# Altium footprint library con-samtec.PCBLIB: 805 footprints (part 36 of 55)
Each footprint in its own frame and in the unit in brackets; x right, y up, seen from the top. Pads: shape width x height; smd on the part's side, far side on the other; paste and mask are expansions set on the pad; w line width, h text height; cw(c..) or ccw(c..) is an arc to the next point about the centre after c.
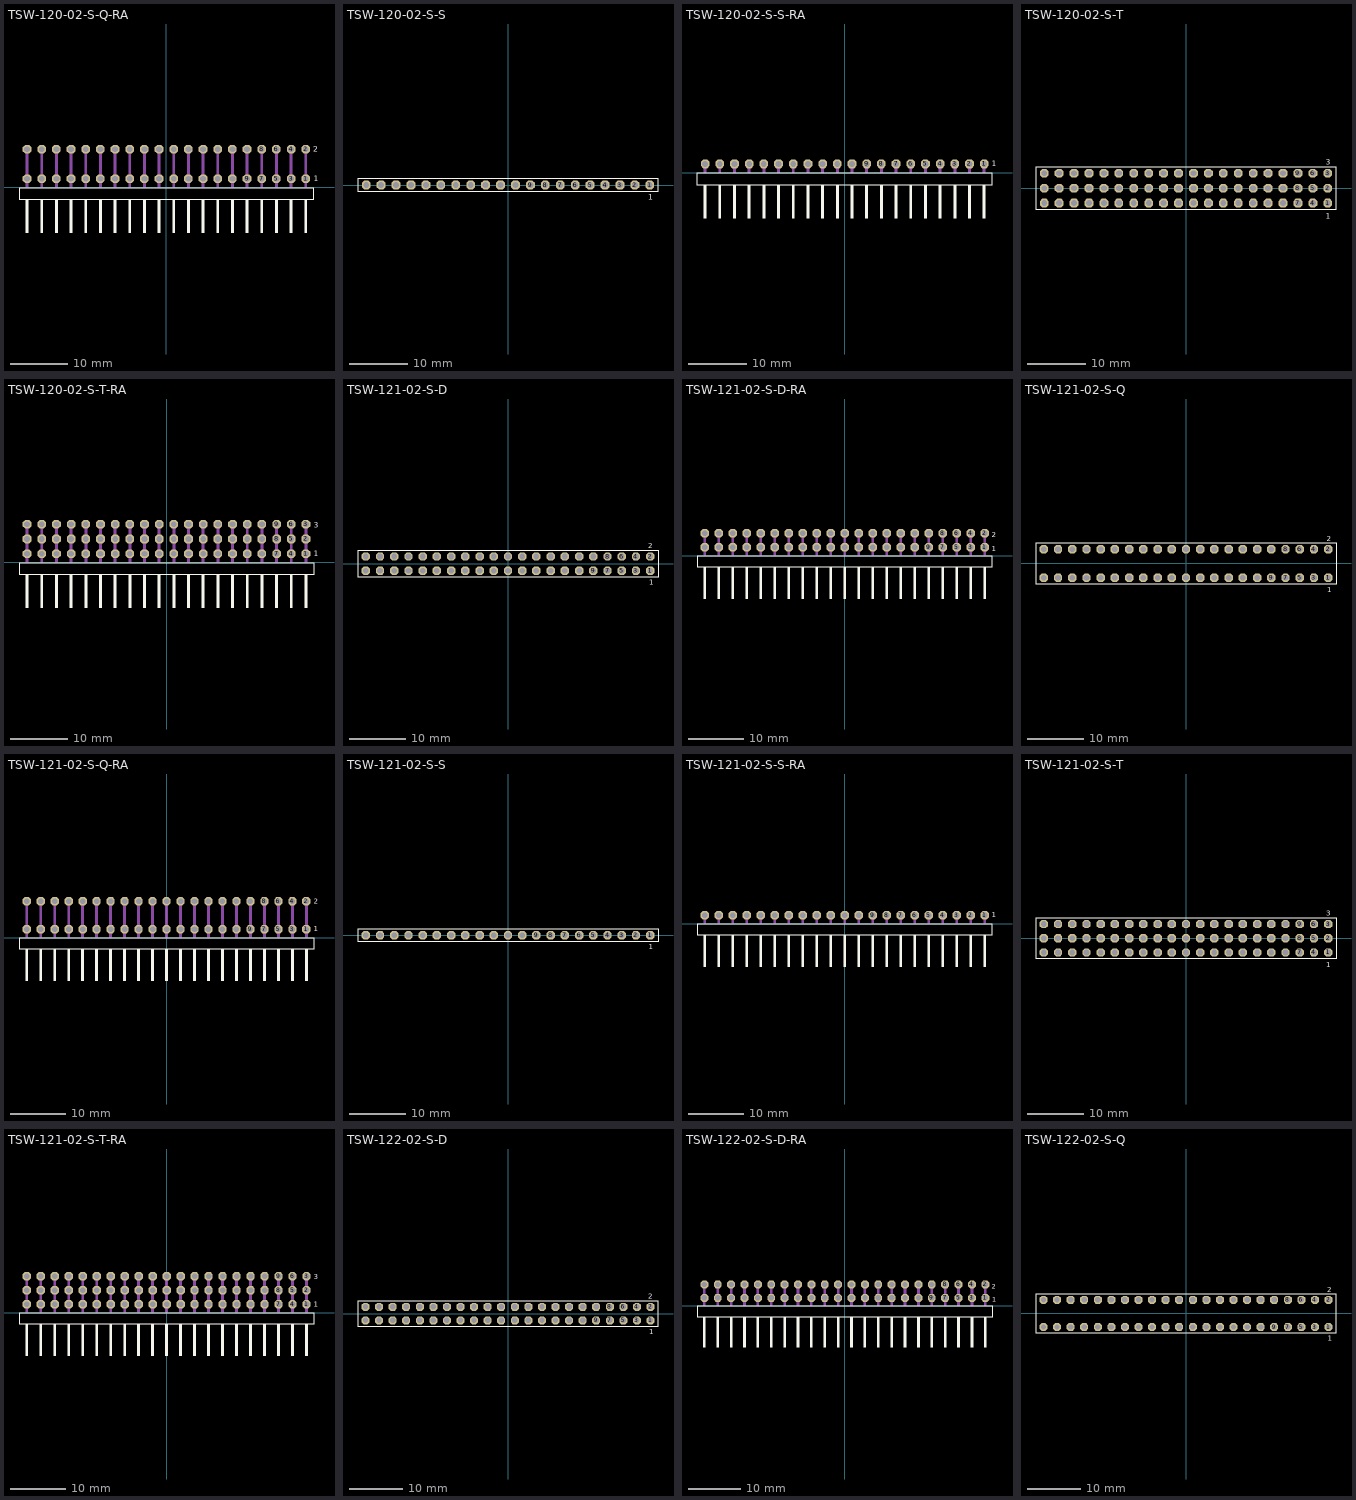
[diagram p35: the footprints below, top view; thin cyan lines are the x and y axes]

## TSW-120-02-S-Q-RA [mil]
pads (40):
  oct 59.06x59.06 hole 39.37: 1(950,60) 2(950,260) 3(850,60) 4(850,260) 5(750,60) 6(750,260) 7(650,60) 8(650,260) 9(550,60) 10(550,260) 11(450,60) 12(450,260) 13(350,60) 14(350,260) 15(250,60) 16(250,260) 17(150,60) 18(150,260) 19(50,60) 20(50,260) 21(-50,60) 22(-50,260) 23(-150,60) 24(-150,260) 25(-250,60) 26(-250,260) 27(-350,60) 28(-350,260) 29(-450,60) 30(-450,260) 31(-550,60) 32(-550,260) 33(-650,60) 34(-650,260) 35(-750,60) 36(-750,260) 37(-850,60) 38(-850,260) 39(-950,60) 40(-950,260)
Top Overlay:
  rectangle: -960,-310.63 -940,-80.32
  rectangle: -860,-310.63 -840,-80.32
  rectangle: -760,-310.63 -740,-80.32
  rectangle: -660,-310.63 -640,-80.32
  rectangle: -560,-310.63 -540,-80.32
  rectangle: -460,-310.63 -440,-80.32
  rectangle: -360,-310.63 -340,-80.32
  rectangle: -260,-310.63 -240,-80.32
  rectangle: -160,-310.63 -140,-80.32
  rectangle: -60,-310.63 -40,-80.32
  rectangle: 40,-310.63 60,-80.32
  rectangle: 140,-310.63 160,-80.32
  rectangle: 240,-310.63 260,-80.32
  rectangle: 340,-310.63 360,-80.32
  rectangle: 440,-310.63 460,-80.32
  rectangle: 540,-310.63 560,-80.32
  rectangle: 640,-310.63 660,-80.32
  rectangle: 740,-310.63 760,-80.32
  rectangle: 840,-310.63 860,-80.32
  rectangle: 940,-310.63 960,-80.32
  lines w8: -1005.08,-80.55 1005.08,-80.55 1005.08,-4.17 -1005.08,-4.17 -1005.08,-80.55
  text "1" at 1003.54,43.31 h36.81
  text "2" at 1001.18,242.72 h36.81
Mechanical 16:
  rectangle: -960,0 -940,270
  rectangle: -860,0 -840,270
  rectangle: -760,0 -740,270
  rectangle: -660,0 -640,270
  rectangle: -560,0 -540,270
  rectangle: -460,0 -440,270
  rectangle: -360,0 -340,270
  rectangle: -260,0 -240,270
  rectangle: -160,0 -140,270
  rectangle: -60,0 -40,270
  rectangle: 40,0 60,270
  rectangle: 140,0 160,270
  rectangle: 240,0 260,270
  rectangle: 340,0 360,270
  rectangle: 440,0 460,270
  rectangle: 540,0 560,270
  rectangle: 640,0 660,270
  rectangle: 740,0 760,270
  rectangle: 840,0 860,270
  rectangle: 940,0 960,270

## TSW-120-02-S-S [mm]
pads (20):
  oct 1.5x1.5 hole 1: 1(24.13,0) 2(21.59,0) 3(19.05,0) 4(16.51,0) 5(13.97,0) 6(11.43,0) 7(8.89,0) 8(6.35,0) 9(3.81,0) 10(1.27,0) 11(-1.27,0) 12(-3.81,0) 13(-6.35,0) 14(-8.89,0) 15(-11.43,0) 16(-13.97,0) 17(-16.51,0) 18(-19.05,0) 19(-21.59,0) 20(-24.13,0)
Top Overlay:
  lines w0.203: -25.529,-1.155 25.529,-1.155 25.529,1.155 -25.529,1.155 -25.529,-1.155
  text "1" at 23.872,-2.498 h0.94
Mechanical 16:
  rectangle: -24.48,-0.35 -23.78,0.35
  rectangle: -21.94,-0.35 -21.24,0.35
  rectangle: -19.4,-0.35 -18.7,0.35
  rectangle: -16.86,-0.35 -16.16,0.35
  rectangle: -14.32,-0.35 -13.62,0.35
  rectangle: -11.78,-0.35 -11.08,0.35
  rectangle: -9.24,-0.35 -8.54,0.35
  rectangle: -6.7,-0.35 -6,0.35
  rectangle: -4.16,-0.35 -3.46,0.35
  rectangle: -1.62,-0.35 -0.92,0.35
  rectangle: 0.92,-0.35 1.62,0.35
  rectangle: 3.46,-0.35 4.16,0.35
  rectangle: 6,-0.35 6.7,0.35
  rectangle: 8.54,-0.35 9.24,0.35
  rectangle: 11.08,-0.35 11.78,0.35
  rectangle: 13.62,-0.35 14.32,0.35
  rectangle: 16.16,-0.35 16.86,0.35
  rectangle: 18.7,-0.35 19.4,0.35
  rectangle: 21.24,-0.35 21.94,0.35
  rectangle: 23.78,-0.35 24.48,0.35

## TSW-120-02-S-S-RA [mil]
pads (20):
  oct 59.06x59.06 hole 39.37: 1(950,60) 2(850,60) 3(750,60) 4(650,60) 5(550,60) 6(450,60) 7(350,60) 8(250,60) 9(150,60) 10(50,60) 11(-50,60) 12(-150,60) 13(-250,60) 14(-350,60) 15(-450,60) 16(-550,60) 17(-650,60) 18(-750,60) 19(-850,60) 20(-950,60)
Top Overlay:
  rectangle: -960,-310.63 -940,-80.32
  rectangle: -860,-310.63 -840,-80.32
  rectangle: -760,-310.63 -740,-80.32
  rectangle: -660,-310.63 -640,-80.32
  rectangle: -560,-310.63 -540,-80.32
  rectangle: -460,-310.63 -440,-80.32
  rectangle: -360,-310.63 -340,-80.32
  rectangle: -260,-310.63 -240,-80.32
  rectangle: -160,-310.63 -140,-80.32
  rectangle: -60,-310.63 -40,-80.32
  rectangle: 40,-310.63 60,-80.32
  rectangle: 140,-310.63 160,-80.32
  rectangle: 240,-310.63 260,-80.32
  rectangle: 340,-310.63 360,-80.32
  rectangle: 440,-310.63 460,-80.32
  rectangle: 540,-310.63 560,-80.32
  rectangle: 640,-310.63 660,-80.32
  rectangle: 740,-310.63 760,-80.32
  rectangle: 840,-310.63 860,-80.32
  rectangle: 940,-310.63 960,-80.32
  lines w8: -1005.08,-80.55 1005.08,-80.55 1005.08,-4.17 -1005.08,-4.17 -1005.08,-80.55
  text "1" at 1000.47,45.35 h36.81
Mechanical 16:
  rectangle: -960,0 -940,70
  rectangle: -860,0 -840,70
  rectangle: -760,0 -740,70
  rectangle: -660,0 -640,70
  rectangle: -560,0 -540,70
  rectangle: -460,0 -440,70
  rectangle: -360,0 -340,70
  rectangle: -260,0 -240,70
  rectangle: -160,0 -140,70
  rectangle: -60,0 -40,70
  rectangle: 40,0 60,70
  rectangle: 140,0 160,70
  rectangle: 240,0 260,70
  rectangle: 340,0 360,70
  rectangle: 440,0 460,70
  rectangle: 540,0 560,70
  rectangle: 640,0 660,70
  rectangle: 740,0 760,70
  rectangle: 840,0 860,70
  rectangle: 940,0 960,70

## TSW-120-02-S-T [mm]
pads (60):
  oct 1.5x1.5 hole 1: 1(24.13,-2.54) 2(24.13,0) 3(24.13,2.54) 4(21.59,-2.54) 5(21.59,0) 6(21.59,2.54) 7(19.05,-2.54) 8(19.05,0) 9(19.05,2.54) 10(16.51,-2.54) 11(16.51,0) 12(16.51,2.54) 13(13.97,-2.54) 14(13.97,0) 15(13.97,2.54) 16(11.43,-2.54) 17(11.43,0) 18(11.43,2.54) 19(8.89,-2.54) 20(8.89,0) 21(8.89,2.54) 22(6.35,-2.54) 23(6.35,0) 24(6.35,2.54) 25(3.81,-2.54) 26(3.81,0) 27(3.81,2.54) 28(1.27,-2.54) 29(1.27,0) 30(1.27,2.54) 31(-1.27,-2.54) 32(-1.27,0) 33(-1.27,2.54) 34(-3.81,-2.54) 35(-3.81,0) 36(-3.81,2.54) 37(-6.35,-2.54) 38(-6.35,0) 39(-6.35,2.54) 40(-8.89,-2.54) 41(-8.89,0) 42(-8.89,2.54) 43(-11.43,-2.54) 44(-11.43,0) 45(-11.43,2.54) 46(-13.97,-2.54) 47(-13.97,0) 48(-13.97,2.54) 49(-16.51,-2.54) 50(-16.51,0) 51(-16.51,2.54) 52(-19.05,-2.54) 53(-19.05,0) 54(-19.05,2.54) 55(-21.59,-2.54) 56(-21.59,0) 57(-21.59,2.54) 58(-24.13,-2.54) 59(-24.13,0) 60(-24.13,2.54)
Top Overlay:
  lines w0.203: -25.529,-3.695 25.529,-3.695 25.529,3.695 -25.529,3.695 -25.529,-3.695
  text "1" at 23.822,-5.188 h0.94
  text "3" at 23.818,3.989 h0.94
Mechanical 16:
  rectangle: -24.48,-2.89 -23.78,-2.19
  rectangle: -24.48,-0.35 -23.78,0.35
  rectangle: -24.48,2.19 -23.78,2.89
  rectangle: -21.94,-2.89 -21.24,-2.19
  rectangle: -21.94,-0.35 -21.24,0.35
  rectangle: -21.94,2.19 -21.24,2.89
  rectangle: -19.4,-2.89 -18.7,-2.19
  rectangle: -19.4,-0.35 -18.7,0.35
  rectangle: -19.4,2.19 -18.7,2.89
  rectangle: -16.86,-2.89 -16.16,-2.19
  rectangle: -16.86,-0.35 -16.16,0.35
  rectangle: -16.86,2.19 -16.16,2.89
  rectangle: -14.32,-2.89 -13.62,-2.19
  rectangle: -14.32,-0.35 -13.62,0.35
  rectangle: -14.32,2.19 -13.62,2.89
  rectangle: -11.78,-2.89 -11.08,-2.19
  rectangle: -11.78,-0.35 -11.08,0.35
  rectangle: -11.78,2.19 -11.08,2.89
  rectangle: -9.24,-2.89 -8.54,-2.19
  rectangle: -9.24,-0.35 -8.54,0.35
  rectangle: -9.24,2.19 -8.54,2.89
  rectangle: -6.7,-2.89 -6,-2.19
  rectangle: -6.7,-0.35 -6,0.35
  rectangle: -6.7,2.19 -6,2.89
  rectangle: -4.16,-2.89 -3.46,-2.19
  rectangle: -4.16,-0.35 -3.46,0.35
  rectangle: -4.16,2.19 -3.46,2.89
  rectangle: -1.62,-2.89 -0.92,-2.19
  rectangle: -1.62,-0.35 -0.92,0.35
  rectangle: -1.62,2.19 -0.92,2.89
  rectangle: 0.92,-2.89 1.62,-2.19
  rectangle: 0.92,-0.35 1.62,0.35
  rectangle: 0.92,2.19 1.62,2.89
  rectangle: 3.46,-2.89 4.16,-2.19
  rectangle: 3.46,-0.35 4.16,0.35
  rectangle: 3.46,2.19 4.16,2.89
  rectangle: 6,-2.89 6.7,-2.19
  rectangle: 6,-0.35 6.7,0.35
  rectangle: 6,2.19 6.7,2.89
  rectangle: 8.54,-2.89 9.24,-2.19
  rectangle: 8.54,-0.35 9.24,0.35
  rectangle: 8.54,2.19 9.24,2.89
  rectangle: 11.08,-2.89 11.78,-2.19
  rectangle: 11.08,-0.35 11.78,0.35
  rectangle: 11.08,2.19 11.78,2.89
  rectangle: 13.62,-2.89 14.32,-2.19
  rectangle: 13.62,-0.35 14.32,0.35
  rectangle: 13.62,2.19 14.32,2.89
  rectangle: 16.16,-2.89 16.86,-2.19
  rectangle: 16.16,-0.35 16.86,0.35
  rectangle: 16.16,2.19 16.86,2.89
  rectangle: 18.7,-2.89 19.4,-2.19
  rectangle: 18.7,-0.35 19.4,0.35
  rectangle: 18.7,2.19 19.4,2.89
  rectangle: 21.24,-2.89 21.94,-2.19
  rectangle: 21.24,-0.35 21.94,0.35
  rectangle: 21.24,2.19 21.94,2.89
  rectangle: 23.78,-2.89 24.48,-2.19
  rectangle: 23.78,-0.35 24.48,0.35
  rectangle: 23.78,2.19 24.48,2.89

## TSW-120-02-S-T-RA [mil]
pads (60):
  oct 59.06x59.06 hole 39.37: 1(950,60) 2(950,160) 3(950,260) 4(850,60) 5(850,160) 6(850,260) 7(750,60) 8(750,160) 9(750,260) 10(650,60) 11(650,160) 12(650,260) 13(550,60) 14(550,160) 15(550,260) 16(450,60) 17(450,160) 18(450,260) 19(350,60) 20(350,160) 21(350,260) 22(250,60) 23(250,160) 24(250,260) 25(150,60) 26(150,160) 27(150,260) 28(50,60) 29(50,160) 30(50,260) 31(-50,60) 32(-50,160) 33(-50,260) 34(-150,60) 35(-150,160) 36(-150,260) 37(-250,60) 38(-250,160) 39(-250,260) 40(-350,60) 41(-350,160) 42(-350,260) 43(-450,60) 44(-450,160) 45(-450,260) 46(-550,60) 47(-550,160) 48(-550,260) 49(-650,60) 50(-650,160) 51(-650,260) 52(-750,60) 53(-750,160) 54(-750,260) 55(-850,60) 56(-850,160) 57(-850,260) 58(-950,60) 59(-950,160) 60(-950,260)
Top Overlay:
  rectangle: -960,-310.63 -940,-80.32
  rectangle: -860,-310.63 -840,-80.32
  rectangle: -760,-310.63 -740,-80.32
  rectangle: -660,-310.63 -640,-80.32
  rectangle: -560,-310.63 -540,-80.32
  rectangle: -460,-310.63 -440,-80.32
  rectangle: -360,-310.63 -340,-80.32
  rectangle: -260,-310.63 -240,-80.32
  rectangle: -160,-310.63 -140,-80.32
  rectangle: -60,-310.63 -40,-80.32
  rectangle: 40,-310.63 60,-80.32
  rectangle: 140,-310.63 160,-80.32
  rectangle: 240,-310.63 260,-80.32
  rectangle: 340,-310.63 360,-80.32
  rectangle: 440,-310.63 460,-80.32
  rectangle: 540,-310.63 560,-80.32
  rectangle: 640,-310.63 660,-80.32
  rectangle: 740,-310.63 760,-80.32
  rectangle: 840,-310.63 860,-80.32
  rectangle: 940,-310.63 960,-80.32
  lines w8: -1005.08,-80.55 1005.08,-80.55 1005.08,-4.17 -1005.08,-4.17 -1005.08,-80.55
  text "1" at 1001.57,41.34 h36.81
  text "3" at 1002.17,236.81 h36.81
Mechanical 16:
  rectangle: -960,0 -940,270
  rectangle: -860,0 -840,270
  rectangle: -760,0 -740,270
  rectangle: -660,0 -640,270
  rectangle: -560,0 -540,270
  rectangle: -460,0 -440,270
  rectangle: -360,0 -340,270
  rectangle: -260,0 -240,270
  rectangle: -160,0 -140,270
  rectangle: -60,0 -40,270
  rectangle: 40,0 60,270
  rectangle: 140,0 160,270
  rectangle: 240,0 260,270
  rectangle: 340,0 360,270
  rectangle: 440,0 460,270
  rectangle: 540,0 560,270
  rectangle: 640,0 660,270
  rectangle: 740,0 760,270
  rectangle: 840,0 860,270
  rectangle: 940,0 960,270

## TSW-121-02-S-D [mm]
pads (42):
  oct 1.5x1.5 hole 1: 1(25.4,-1.27) 2(25.4,1.27) 3(22.86,-1.27) 4(22.86,1.27) 5(20.32,-1.27) 6(20.32,1.27) 7(17.78,-1.27) 8(17.78,1.27) 9(15.24,-1.27) 10(15.24,1.27) 11(12.7,-1.27) 12(12.7,1.27) 13(10.16,-1.27) 14(10.16,1.27) 15(7.62,-1.27) 16(7.62,1.27) 17(5.08,-1.27) 18(5.08,1.27) 19(2.54,-1.27) 20(2.54,1.27) 21(0,-1.27) 22(0,1.27) 23(-2.54,-1.27) 24(-2.54,1.27) 25(-5.08,-1.27) 26(-5.08,1.27) 27(-7.62,-1.27) 28(-7.62,1.27) 29(-10.16,-1.27) 30(-10.16,1.27) 31(-12.7,-1.27) 32(-12.7,1.27) 33(-15.24,-1.27) 34(-15.24,1.27) 35(-17.78,-1.27) 36(-17.78,1.27) 37(-20.32,-1.27) 38(-20.32,1.27) 39(-22.86,-1.27) 40(-22.86,1.27) 41(-25.4,-1.27) 42(-25.4,1.27)
Top Overlay:
  lines w0.203: -26.799,-2.425 26.799,-2.425 26.799,2.425 -26.799,2.425 -26.799,-2.425
  text "1" at 25.192,-3.818 h0.94
  text "2" at 25.017,2.744 h0.94
Mechanical 16:
  rectangle: -25.75,-1.62 -25.05,-0.92
  rectangle: -25.75,0.92 -25.05,1.62
  rectangle: -23.21,-1.62 -22.51,-0.92
  rectangle: -23.21,0.92 -22.51,1.62
  rectangle: -20.67,-1.62 -19.97,-0.92
  rectangle: -20.67,0.92 -19.97,1.62
  rectangle: -18.13,-1.62 -17.43,-0.92
  rectangle: -18.13,0.92 -17.43,1.62
  rectangle: -15.59,-1.62 -14.89,-0.92
  rectangle: -15.59,0.92 -14.89,1.62
  rectangle: -13.05,-1.62 -12.35,-0.92
  rectangle: -13.05,0.92 -12.35,1.62
  rectangle: -10.51,-1.62 -9.81,-0.92
  rectangle: -10.51,0.92 -9.81,1.62
  rectangle: -7.97,-1.62 -7.27,-0.92
  rectangle: -7.97,0.92 -7.27,1.62
  rectangle: -5.43,-1.62 -4.73,-0.92
  rectangle: -5.43,0.92 -4.73,1.62
  rectangle: -2.89,-1.62 -2.19,-0.92
  rectangle: -2.89,0.92 -2.19,1.62
  rectangle: -0.35,-1.62 0.35,-0.92
  rectangle: -0.35,0.92 0.35,1.62
  rectangle: 2.19,-1.62 2.89,-0.92
  rectangle: 2.19,0.92 2.89,1.62
  rectangle: 4.73,-1.62 5.43,-0.92
  rectangle: 4.73,0.92 5.43,1.62
  rectangle: 7.27,-1.62 7.97,-0.92
  rectangle: 7.27,0.92 7.97,1.62
  rectangle: 9.81,-1.62 10.51,-0.92
  rectangle: 9.81,0.92 10.51,1.62
  rectangle: 12.35,-1.62 13.05,-0.92
  rectangle: 12.35,0.92 13.05,1.62
  rectangle: 14.89,-1.62 15.59,-0.92
  rectangle: 14.89,0.92 15.59,1.62
  rectangle: 17.43,-1.62 18.13,-0.92
  rectangle: 17.43,0.92 18.13,1.62
  rectangle: 19.97,-1.62 20.67,-0.92
  rectangle: 19.97,0.92 20.67,1.62
  rectangle: 22.51,-1.62 23.21,-0.92
  rectangle: 22.51,0.92 23.21,1.62
  rectangle: 25.05,-1.62 25.75,-0.92
  rectangle: 25.05,0.92 25.75,1.62

## TSW-121-02-S-D-RA [mil]
pads (42):
  oct 59.06x59.06 hole 39.37: 1(1000,60) 2(1000,160) 3(900,60) 4(900,160) 5(800,60) 6(800,160) 7(700,60) 8(700,160) 9(600,60) 10(600,160) 11(500,60) 12(500,160) 13(400,60) 14(400,160) 15(300,60) 16(300,160) 17(200,60) 18(200,160) 19(100,60) 20(100,160) 21(0,60) 22(0,160) 23(-100,60) 24(-100,160) 25(-200,60) 26(-200,160) 27(-300,60) 28(-300,160) 29(-400,60) 30(-400,160) 31(-500,60) 32(-500,160) 33(-600,60) 34(-600,160) 35(-700,60) 36(-700,160) 37(-800,60) 38(-800,160) 39(-900,60) 40(-900,160) 41(-1000,60) 42(-1000,160)
Top Overlay:
  rectangle: -1010,-310.63 -990,-80.32
  rectangle: -910,-310.63 -890,-80.32
  rectangle: -810,-310.63 -790,-80.32
  rectangle: -710,-310.63 -690,-80.32
  rectangle: -610,-310.63 -590,-80.32
  rectangle: -510,-310.63 -490,-80.32
  rectangle: -410,-310.63 -390,-80.32
  rectangle: -310,-310.63 -290,-80.32
  rectangle: -210,-310.63 -190,-80.32
  rectangle: -110,-310.63 -90,-80.32
  rectangle: -10,-310.63 10,-80.32
  rectangle: 90,-310.63 110,-80.32
  rectangle: 190,-310.63 210,-80.32
  rectangle: 290,-310.63 310,-80.32
  rectangle: 390,-310.63 410,-80.32
  rectangle: 490,-310.63 510,-80.32
  rectangle: 590,-310.63 610,-80.32
  rectangle: 690,-310.63 710,-80.32
  rectangle: 790,-310.63 810,-80.32
  rectangle: 890,-310.63 910,-80.32
  rectangle: 990,-310.63 1010,-80.32
  lines w8: -1055.08,-80.55 1055.08,-80.55 1055.08,-4.17 -1055.08,-4.17 -1055.08,-80.55
  text "1" at 1050.59,30.51 h36.81
  text "2" at 1049.21,129.53 h36.81
Mechanical 16:
  rectangle: -1010,0 -990,170
  rectangle: -910,0 -890,170
  rectangle: -810,0 -790,170
  rectangle: -710,0 -690,170
  rectangle: -610,0 -590,170
  rectangle: -510,0 -490,170
  rectangle: -410,0 -390,170
  rectangle: -310,0 -290,170
  rectangle: -210,0 -190,170
  rectangle: -110,0 -90,170
  rectangle: -10,0 10,170
  rectangle: 90,0 110,170
  rectangle: 190,0 210,170
  rectangle: 290,0 310,170
  rectangle: 390,0 410,170
  rectangle: 490,0 510,170
  rectangle: 590,0 610,170
  rectangle: 690,0 710,170
  rectangle: 790,0 810,170
  rectangle: 890,0 910,170
  rectangle: 990,0 1010,170

## TSW-121-02-S-Q [mm]
pads (42):
  oct 1.5x1.5 hole 1: 1(25.4,-2.54) 2(25.4,2.54) 3(22.86,-2.54) 4(22.86,2.54) 5(20.32,-2.54) 6(20.32,2.54) 7(17.78,-2.54) 8(17.78,2.54) 9(15.24,-2.54) 10(15.24,2.54) 11(12.7,-2.54) 12(12.7,2.54) 13(10.16,-2.54) 14(10.16,2.54) 15(7.62,-2.54) 16(7.62,2.54) 17(5.08,-2.54) 18(5.08,2.54) 19(2.54,-2.54) 20(2.54,2.54) 21(0,-2.54) 22(0,2.54) 23(-2.54,-2.54) 24(-2.54,2.54) 25(-5.08,-2.54) 26(-5.08,2.54) 27(-7.62,-2.54) 28(-7.62,2.54) 29(-10.16,-2.54) 30(-10.16,2.54) 31(-12.7,-2.54) 32(-12.7,2.54) 33(-15.24,-2.54) 34(-15.24,2.54) 35(-17.78,-2.54) 36(-17.78,2.54) 37(-20.32,-2.54) 38(-20.32,2.54) 39(-22.86,-2.54) 40(-22.86,2.54) 41(-25.4,-2.54) 42(-25.4,2.54)
Top Overlay:
  lines w0.203: -26.799,-3.695 26.799,-3.695 26.799,3.695 -26.799,3.695 -26.799,-3.695
  text "1" at 25.242,-5.138 h0.94
  text "2" at 25.142,3.989 h0.94
Mechanical 16:
  rectangle: -25.75,-2.89 -25.05,-2.19
  rectangle: -25.75,2.19 -25.05,2.89
  rectangle: -23.21,-2.89 -22.51,-2.19
  rectangle: -23.21,2.19 -22.51,2.89
  rectangle: -20.67,-2.89 -19.97,-2.19
  rectangle: -20.67,2.19 -19.97,2.89
  rectangle: -18.13,-2.89 -17.43,-2.19
  rectangle: -18.13,2.19 -17.43,2.89
  rectangle: -15.59,-2.89 -14.89,-2.19
  rectangle: -15.59,2.19 -14.89,2.89
  rectangle: -13.05,-2.89 -12.35,-2.19
  rectangle: -13.05,2.19 -12.35,2.89
  rectangle: -10.51,-2.89 -9.81,-2.19
  rectangle: -10.51,2.19 -9.81,2.89
  rectangle: -7.97,-2.89 -7.27,-2.19
  rectangle: -7.97,2.19 -7.27,2.89
  rectangle: -5.43,-2.89 -4.73,-2.19
  rectangle: -5.43,2.19 -4.73,2.89
  rectangle: -2.89,-2.89 -2.19,-2.19
  rectangle: -2.89,2.19 -2.19,2.89
  rectangle: -0.35,-2.89 0.35,-2.19
  rectangle: -0.35,2.19 0.35,2.89
  rectangle: 2.19,-2.89 2.89,-2.19
  rectangle: 2.19,2.19 2.89,2.89
  rectangle: 4.73,-2.89 5.43,-2.19
  rectangle: 4.73,2.19 5.43,2.89
  rectangle: 7.27,-2.89 7.97,-2.19
  rectangle: 7.27,2.19 7.97,2.89
  rectangle: 9.81,-2.89 10.51,-2.19
  rectangle: 9.81,2.19 10.51,2.89
  rectangle: 12.35,-2.89 13.05,-2.19
  rectangle: 12.35,2.19 13.05,2.89
  rectangle: 14.89,-2.89 15.59,-2.19
  rectangle: 14.89,2.19 15.59,2.89
  rectangle: 17.43,-2.89 18.13,-2.19
  rectangle: 17.43,2.19 18.13,2.89
  rectangle: 19.97,-2.89 20.67,-2.19
  rectangle: 19.97,2.19 20.67,2.89
  rectangle: 22.51,-2.89 23.21,-2.19
  rectangle: 22.51,2.19 23.21,2.89
  rectangle: 25.05,-2.89 25.75,-2.19
  rectangle: 25.05,2.19 25.75,2.89

## TSW-121-02-S-Q-RA [mil]
pads (42):
  oct 59.06x59.06 hole 39.37: 1(1000,60) 2(1000,260) 3(900,60) 4(900,260) 5(800,60) 6(800,260) 7(700,60) 8(700,260) 9(600,60) 10(600,260) 11(500,60) 12(500,260) 13(400,60) 14(400,260) 15(300,60) 16(300,260) 17(200,60) 18(200,260) 19(100,60) 20(100,260) 21(0,60) 22(0,260) 23(-100,60) 24(-100,260) 25(-200,60) 26(-200,260) 27(-300,60) 28(-300,260) 29(-400,60) 30(-400,260) 31(-500,60) 32(-500,260) 33(-600,60) 34(-600,260) 35(-700,60) 36(-700,260) 37(-800,60) 38(-800,260) 39(-900,60) 40(-900,260) 41(-1000,60) 42(-1000,260)
Top Overlay:
  rectangle: -1010,-310.63 -990,-80.32
  rectangle: -910,-310.63 -890,-80.32
  rectangle: -810,-310.63 -790,-80.32
  rectangle: -710,-310.63 -690,-80.32
  rectangle: -610,-310.63 -590,-80.32
  rectangle: -510,-310.63 -490,-80.32
  rectangle: -410,-310.63 -390,-80.32
  rectangle: -310,-310.63 -290,-80.32
  rectangle: -210,-310.63 -190,-80.32
  rectangle: -110,-310.63 -90,-80.32
  rectangle: -10,-310.63 10,-80.32
  rectangle: 90,-310.63 110,-80.32
  rectangle: 190,-310.63 210,-80.32
  rectangle: 290,-310.63 310,-80.32
  rectangle: 390,-310.63 410,-80.32
  rectangle: 490,-310.63 510,-80.32
  rectangle: 590,-310.63 610,-80.32
  rectangle: 690,-310.63 710,-80.32
  rectangle: 790,-310.63 810,-80.32
  rectangle: 890,-310.63 910,-80.32
  rectangle: 990,-310.63 1010,-80.32
  lines w8: -1055.08,-80.55 1055.08,-80.55 1055.08,-4.17 -1055.08,-4.17 -1055.08,-80.55
  text "1" at 1053.54,43.31 h36.81
  text "2" at 1051.18,242.72 h36.81
Mechanical 16:
  rectangle: -1010,0 -990,270
  rectangle: -910,0 -890,270
  rectangle: -810,0 -790,270
  rectangle: -710,0 -690,270
  rectangle: -610,0 -590,270
  rectangle: -510,0 -490,270
  rectangle: -410,0 -390,270
  rectangle: -310,0 -290,270
  rectangle: -210,0 -190,270
  rectangle: -110,0 -90,270
  rectangle: -10,0 10,270
  rectangle: 90,0 110,270
  rectangle: 190,0 210,270
  rectangle: 290,0 310,270
  rectangle: 390,0 410,270
  rectangle: 490,0 510,270
  rectangle: 590,0 610,270
  rectangle: 690,0 710,270
  rectangle: 790,0 810,270
  rectangle: 890,0 910,270
  rectangle: 990,0 1010,270

## TSW-121-02-S-S [mm]
pads (21):
  oct 1.5x1.5 hole 1: 1(25.4,0) 2(22.86,0) 3(20.32,0) 4(17.78,0) 5(15.24,0) 6(12.7,0) 7(10.16,0) 8(7.62,0) 9(5.08,0) 10(2.54,0) 11(0,0) 12(-2.54,0) 13(-5.08,0) 14(-7.62,0) 15(-10.16,0) 16(-12.7,0) 17(-15.24,0) 18(-17.78,0) 19(-20.32,0) 20(-22.86,0) 21(-25.4,0)
Top Overlay:
  lines w0.203: -26.799,-1.155 26.799,-1.155 26.799,1.155 -26.799,1.155 -26.799,-1.155
  text "1" at 25.142,-2.498 h0.94
Mechanical 16:
  rectangle: -25.75,-0.35 -25.05,0.35
  rectangle: -23.21,-0.35 -22.51,0.35
  rectangle: -20.67,-0.35 -19.97,0.35
  rectangle: -18.13,-0.35 -17.43,0.35
  rectangle: -15.59,-0.35 -14.89,0.35
  rectangle: -13.05,-0.35 -12.35,0.35
  rectangle: -10.51,-0.35 -9.81,0.35
  rectangle: -7.97,-0.35 -7.27,0.35
  rectangle: -5.43,-0.35 -4.73,0.35
  rectangle: -2.89,-0.35 -2.19,0.35
  rectangle: -0.35,-0.35 0.35,0.35
  rectangle: 2.19,-0.35 2.89,0.35
  rectangle: 4.73,-0.35 5.43,0.35
  rectangle: 7.27,-0.35 7.97,0.35
  rectangle: 9.81,-0.35 10.51,0.35
  rectangle: 12.35,-0.35 13.05,0.35
  rectangle: 14.89,-0.35 15.59,0.35
  rectangle: 17.43,-0.35 18.13,0.35
  rectangle: 19.97,-0.35 20.67,0.35
  rectangle: 22.51,-0.35 23.21,0.35
  rectangle: 25.05,-0.35 25.75,0.35

## TSW-121-02-S-S-RA [mil]
pads (21):
  oct 59.06x59.06 hole 39.37: 1(1000,60) 2(900,60) 3(800,60) 4(700,60) 5(600,60) 6(500,60) 7(400,60) 8(300,60) 9(200,60) 10(100,60) 11(0,60) 12(-100,60) 13(-200,60) 14(-300,60) 15(-400,60) 16(-500,60) 17(-600,60) 18(-700,60) 19(-800,60) 20(-900,60) 21(-1000,60)
Top Overlay:
  rectangle: -1010,-310.63 -990,-80.32
  rectangle: -910,-310.63 -890,-80.32
  rectangle: -810,-310.63 -790,-80.32
  rectangle: -710,-310.63 -690,-80.32
  rectangle: -610,-310.63 -590,-80.32
  rectangle: -510,-310.63 -490,-80.32
  rectangle: -410,-310.63 -390,-80.32
  rectangle: -310,-310.63 -290,-80.32
  rectangle: -210,-310.63 -190,-80.32
  rectangle: -110,-310.63 -90,-80.32
  rectangle: -10,-310.63 10,-80.32
  rectangle: 90,-310.63 110,-80.32
  rectangle: 190,-310.63 210,-80.32
  rectangle: 290,-310.63 310,-80.32
  rectangle: 390,-310.63 410,-80.32
  rectangle: 490,-310.63 510,-80.32
  rectangle: 590,-310.63 610,-80.32
  rectangle: 690,-310.63 710,-80.32
  rectangle: 790,-310.63 810,-80.32
  rectangle: 890,-310.63 910,-80.32
  rectangle: 990,-310.63 1010,-80.32
  lines w8: -1055.08,-80.55 1055.08,-80.55 1055.08,-4.17 -1055.08,-4.17 -1055.08,-80.55
  text "1" at 1050.47,45.35 h36.81
Mechanical 16:
  rectangle: -1010,0 -990,70
  rectangle: -910,0 -890,70
  rectangle: -810,0 -790,70
  rectangle: -710,0 -690,70
  rectangle: -610,0 -590,70
  rectangle: -510,0 -490,70
  rectangle: -410,0 -390,70
  rectangle: -310,0 -290,70
  rectangle: -210,0 -190,70
  rectangle: -110,0 -90,70
  rectangle: -10,0 10,70
  rectangle: 90,0 110,70
  rectangle: 190,0 210,70
  rectangle: 290,0 310,70
  rectangle: 390,0 410,70
  rectangle: 490,0 510,70
  rectangle: 590,0 610,70
  rectangle: 690,0 710,70
  rectangle: 790,0 810,70
  rectangle: 890,0 910,70
  rectangle: 990,0 1010,70

## TSW-121-02-S-T [mm]
pads (63):
  oct 1.5x1.5 hole 1: 1(25.4,-2.54) 2(25.4,0) 3(25.4,2.54) 4(22.86,-2.54) 5(22.86,0) 6(22.86,2.54) 7(20.32,-2.54) 8(20.32,0) 9(20.32,2.54) 10(17.78,-2.54) 11(17.78,0) 12(17.78,2.54) 13(15.24,-2.54) 14(15.24,0) 15(15.24,2.54) 16(12.7,-2.54) 17(12.7,0) 18(12.7,2.54) 19(10.16,-2.54) 20(10.16,0) 21(10.16,2.54) 22(7.62,-2.54) 23(7.62,0) 24(7.62,2.54) 25(5.08,-2.54) 26(5.08,0) 27(5.08,2.54) 28(2.54,-2.54) 29(2.54,0) 30(2.54,2.54) 31(0,-2.54) 32(0,0) 33(0,2.54) 34(-2.54,-2.54) 35(-2.54,0) 36(-2.54,2.54) 37(-5.08,-2.54) 38(-5.08,0) 39(-5.08,2.54) 40(-7.62,-2.54) 41(-7.62,0) 42(-7.62,2.54) 43(-10.16,-2.54) 44(-10.16,0) 45(-10.16,2.54) 46(-12.7,-2.54) 47(-12.7,0) 48(-12.7,2.54) 49(-15.24,-2.54) 50(-15.24,0) 51(-15.24,2.54) 52(-17.78,-2.54) 53(-17.78,0) 54(-17.78,2.54) 55(-20.32,-2.54) 56(-20.32,0) 57(-20.32,2.54) 58(-22.86,-2.54) 59(-22.86,0) 60(-22.86,2.54) 61(-25.4,-2.54) 62(-25.4,0) 63(-25.4,2.54)
Top Overlay:
  lines w0.203: -26.799,-3.695 26.799,-3.695 26.799,3.695 -26.799,3.695 -26.799,-3.695
  text "1" at 25.092,-5.188 h0.94
  text "3" at 25.088,3.989 h0.94
Mechanical 16:
  rectangle: -25.75,-2.89 -25.05,-2.19
  rectangle: -25.75,-0.35 -25.05,0.35
  rectangle: -25.75,2.19 -25.05,2.89
  rectangle: -23.21,-2.89 -22.51,-2.19
  rectangle: -23.21,-0.35 -22.51,0.35
  rectangle: -23.21,2.19 -22.51,2.89
  rectangle: -20.67,-2.89 -19.97,-2.19
  rectangle: -20.67,-0.35 -19.97,0.35
  rectangle: -20.67,2.19 -19.97,2.89
  rectangle: -18.13,-2.89 -17.43,-2.19
  rectangle: -18.13,-0.35 -17.43,0.35
  rectangle: -18.13,2.19 -17.43,2.89
  rectangle: -15.59,-2.89 -14.89,-2.19
  rectangle: -15.59,-0.35 -14.89,0.35
  rectangle: -15.59,2.19 -14.89,2.89
  rectangle: -13.05,-2.89 -12.35,-2.19
  rectangle: -13.05,-0.35 -12.35,0.35
  rectangle: -13.05,2.19 -12.35,2.89
  rectangle: -10.51,-2.89 -9.81,-2.19
  rectangle: -10.51,-0.35 -9.81,0.35
  rectangle: -10.51,2.19 -9.81,2.89
  rectangle: -7.97,-2.89 -7.27,-2.19
  rectangle: -7.97,-0.35 -7.27,0.35
  rectangle: -7.97,2.19 -7.27,2.89
  rectangle: -5.43,-2.89 -4.73,-2.19
  rectangle: -5.43,-0.35 -4.73,0.35
  rectangle: -5.43,2.19 -4.73,2.89
  rectangle: -2.89,-2.89 -2.19,-2.19
  rectangle: -2.89,-0.35 -2.19,0.35
  rectangle: -2.89,2.19 -2.19,2.89
  rectangle: -0.35,-2.89 0.35,-2.19
  rectangle: -0.35,-0.35 0.35,0.35
  rectangle: -0.35,2.19 0.35,2.89
  rectangle: 2.19,-2.89 2.89,-2.19
  rectangle: 2.19,-0.35 2.89,0.35
  rectangle: 2.19,2.19 2.89,2.89
  rectangle: 4.73,-2.89 5.43,-2.19
  rectangle: 4.73,-0.35 5.43,0.35
  rectangle: 4.73,2.19 5.43,2.89
  rectangle: 7.27,-2.89 7.97,-2.19
  rectangle: 7.27,-0.35 7.97,0.35
  rectangle: 7.27,2.19 7.97,2.89
  rectangle: 9.81,-2.89 10.51,-2.19
  rectangle: 9.81,-0.35 10.51,0.35
  rectangle: 9.81,2.19 10.51,2.89
  rectangle: 12.35,-2.89 13.05,-2.19
  rectangle: 12.35,-0.35 13.05,0.35
  rectangle: 12.35,2.19 13.05,2.89
  rectangle: 14.89,-2.89 15.59,-2.19
  rectangle: 14.89,-0.35 15.59,0.35
  rectangle: 14.89,2.19 15.59,2.89
  rectangle: 17.43,-2.89 18.13,-2.19
  rectangle: 17.43,-0.35 18.13,0.35
  rectangle: 17.43,2.19 18.13,2.89
  rectangle: 19.97,-2.89 20.67,-2.19
  rectangle: 19.97,-0.35 20.67,0.35
  rectangle: 19.97,2.19 20.67,2.89
  rectangle: 22.51,-2.89 23.21,-2.19
  rectangle: 22.51,-0.35 23.21,0.35
  rectangle: 22.51,2.19 23.21,2.89
  rectangle: 25.05,-2.89 25.75,-2.19
  rectangle: 25.05,-0.35 25.75,0.35
  rectangle: 25.05,2.19 25.75,2.89

## TSW-121-02-S-T-RA [mil]
pads (63):
  oct 59.06x59.06 hole 39.37: 1(1000,60) 2(1000,160) 3(1000,260) 4(900,60) 5(900,160) 6(900,260) 7(800,60) 8(800,160) 9(800,260) 10(700,60) 11(700,160) 12(700,260) 13(600,60) 14(600,160) 15(600,260) 16(500,60) 17(500,160) 18(500,260) 19(400,60) 20(400,160) 21(400,260) 22(300,60) 23(300,160) 24(300,260) 25(200,60) 26(200,160) 27(200,260) 28(100,60) 29(100,160) 30(100,260) 31(0,60) 32(0,160) 33(0,260) 34(-100,60) 35(-100,160) 36(-100,260) 37(-200,60) 38(-200,160) 39(-200,260) 40(-300,60) 41(-300,160) 42(-300,260) 43(-400,60) 44(-400,160) 45(-400,260) 46(-500,60) 47(-500,160) 48(-500,260) 49(-600,60) 50(-600,160) 51(-600,260) 52(-700,60) 53(-700,160) 54(-700,260) 55(-800,60) 56(-800,160) 57(-800,260) 58(-900,60) 59(-900,160) 60(-900,260) 61(-1000,60) 62(-1000,160) 63(-1000,260)
Top Overlay:
  rectangle: -1010,-310.63 -990,-80.32
  rectangle: -910,-310.63 -890,-80.32
  rectangle: -810,-310.63 -790,-80.32
  rectangle: -710,-310.63 -690,-80.32
  rectangle: -610,-310.63 -590,-80.32
  rectangle: -510,-310.63 -490,-80.32
  rectangle: -410,-310.63 -390,-80.32
  rectangle: -310,-310.63 -290,-80.32
  rectangle: -210,-310.63 -190,-80.32
  rectangle: -110,-310.63 -90,-80.32
  rectangle: -10,-310.63 10,-80.32
  rectangle: 90,-310.63 110,-80.32
  rectangle: 190,-310.63 210,-80.32
  rectangle: 290,-310.63 310,-80.32
  rectangle: 390,-310.63 410,-80.32
  rectangle: 490,-310.63 510,-80.32
  rectangle: 590,-310.63 610,-80.32
  rectangle: 690,-310.63 710,-80.32
  rectangle: 790,-310.63 810,-80.32
  rectangle: 890,-310.63 910,-80.32
  rectangle: 990,-310.63 1010,-80.32
  lines w8: -1055.08,-80.55 1055.08,-80.55 1055.08,-4.17 -1055.08,-4.17 -1055.08,-80.55
  text "1" at 1051.57,41.34 h36.81
  text "3" at 1052.17,236.81 h36.81
Mechanical 16:
  rectangle: -1010,0 -990,270
  rectangle: -910,0 -890,270
  rectangle: -810,0 -790,270
  rectangle: -710,0 -690,270
  rectangle: -610,0 -590,270
  rectangle: -510,0 -490,270
  rectangle: -410,0 -390,270
  rectangle: -310,0 -290,270
  rectangle: -210,0 -190,270
  rectangle: -110,0 -90,270
  rectangle: -10,0 10,270
  rectangle: 90,0 110,270
  rectangle: 190,0 210,270
  rectangle: 290,0 310,270
  rectangle: 390,0 410,270
  rectangle: 490,0 510,270
  rectangle: 590,0 610,270
  rectangle: 690,0 710,270
  rectangle: 790,0 810,270
  rectangle: 890,0 910,270
  rectangle: 990,0 1010,270

## TSW-122-02-S-D [mm]
pads (44):
  oct 1.5x1.5 hole 1: 1(26.67,-1.27) 2(26.67,1.27) 3(24.13,-1.27) 4(24.13,1.27) 5(21.59,-1.27) 6(21.59,1.27) 7(19.05,-1.27) 8(19.05,1.27) 9(16.51,-1.27) 10(16.51,1.27) 11(13.97,-1.27) 12(13.97,1.27) 13(11.43,-1.27) 14(11.43,1.27) 15(8.89,-1.27) 16(8.89,1.27) 17(6.35,-1.27) 18(6.35,1.27) 19(3.81,-1.27) 20(3.81,1.27) 21(1.27,-1.27) 22(1.27,1.27) 23(-1.27,-1.27) 24(-1.27,1.27) 25(-3.81,-1.27) 26(-3.81,1.27) 27(-6.35,-1.27) 28(-6.35,1.27) 29(-8.89,-1.27) 30(-8.89,1.27) 31(-11.43,-1.27) 32(-11.43,1.27) 33(-13.97,-1.27) 34(-13.97,1.27) 35(-16.51,-1.27) 36(-16.51,1.27) 37(-19.05,-1.27) 38(-19.05,1.27) 39(-21.59,-1.27) 40(-21.59,1.27) 41(-24.13,-1.27) 42(-24.13,1.27) 43(-26.67,-1.27) 44(-26.67,1.27)
Top Overlay:
  lines w0.203: -28.069,-2.425 28.069,-2.425 28.069,2.425 -28.069,2.425 -28.069,-2.425
  text "1" at 26.462,-3.818 h0.94
  text "2" at 26.287,2.744 h0.94
Mechanical 16:
  rectangle: -27.02,-1.62 -26.32,-0.92
  rectangle: -27.02,0.92 -26.32,1.62
  rectangle: -24.48,-1.62 -23.78,-0.92
  rectangle: -24.48,0.92 -23.78,1.62
  rectangle: -21.94,-1.62 -21.24,-0.92
  rectangle: -21.94,0.92 -21.24,1.62
  rectangle: -19.4,-1.62 -18.7,-0.92
  rectangle: -19.4,0.92 -18.7,1.62
  rectangle: -16.86,-1.62 -16.16,-0.92
  rectangle: -16.86,0.92 -16.16,1.62
  rectangle: -14.32,-1.62 -13.62,-0.92
  rectangle: -14.32,0.92 -13.62,1.62
  rectangle: -11.78,-1.62 -11.08,-0.92
  rectangle: -11.78,0.92 -11.08,1.62
  rectangle: -9.24,-1.62 -8.54,-0.92
  rectangle: -9.24,0.92 -8.54,1.62
  rectangle: -6.7,-1.62 -6,-0.92
  rectangle: -6.7,0.92 -6,1.62
  rectangle: -4.16,-1.62 -3.46,-0.92
  rectangle: -4.16,0.92 -3.46,1.62
  rectangle: -1.62,-1.62 -0.92,-0.92
  rectangle: -1.62,0.92 -0.92,1.62
  rectangle: 0.92,-1.62 1.62,-0.92
  rectangle: 0.92,0.92 1.62,1.62
  rectangle: 3.46,-1.62 4.16,-0.92
  rectangle: 3.46,0.92 4.16,1.62
  rectangle: 6,-1.62 6.7,-0.92
  rectangle: 6,0.92 6.7,1.62
  rectangle: 8.54,-1.62 9.24,-0.92
  rectangle: 8.54,0.92 9.24,1.62
  rectangle: 11.08,-1.62 11.78,-0.92
  rectangle: 11.08,0.92 11.78,1.62
  rectangle: 13.62,-1.62 14.32,-0.92
  rectangle: 13.62,0.92 14.32,1.62
  rectangle: 16.16,-1.62 16.86,-0.92
  rectangle: 16.16,0.92 16.86,1.62
  rectangle: 18.7,-1.62 19.4,-0.92
  rectangle: 18.7,0.92 19.4,1.62
  rectangle: 21.24,-1.62 21.94,-0.92
  rectangle: 21.24,0.92 21.94,1.62
  rectangle: 23.78,-1.62 24.48,-0.92
  rectangle: 23.78,0.92 24.48,1.62
  rectangle: 26.32,-1.62 27.02,-0.92
  rectangle: 26.32,0.92 27.02,1.62

## TSW-122-02-S-D-RA [mil]
pads (44):
  oct 59.06x59.06 hole 39.37: 1(1050,60) 2(1050,160) 3(950,60) 4(950,160) 5(850,60) 6(850,160) 7(750,60) 8(750,160) 9(650,60) 10(650,160) 11(550,60) 12(550,160) 13(450,60) 14(450,160) 15(350,60) 16(350,160) 17(250,60) 18(250,160) 19(150,60) 20(150,160) 21(50,60) 22(50,160) 23(-50,60) 24(-50,160) 25(-150,60) 26(-150,160) 27(-250,60) 28(-250,160) 29(-350,60) 30(-350,160) 31(-450,60) 32(-450,160) 33(-550,60) 34(-550,160) 35(-650,60) 36(-650,160) 37(-750,60) 38(-750,160) 39(-850,60) 40(-850,160) 41(-950,60) 42(-950,160) 43(-1050,60) 44(-1050,160)
Top Overlay:
  rectangle: -1060,-310.63 -1040,-80.32
  rectangle: -960,-310.63 -940,-80.32
  rectangle: -860,-310.63 -840,-80.32
  rectangle: -760,-310.63 -740,-80.32
  rectangle: -660,-310.63 -640,-80.32
  rectangle: -560,-310.63 -540,-80.32
  rectangle: -460,-310.63 -440,-80.32
  rectangle: -360,-310.63 -340,-80.32
  rectangle: -260,-310.63 -240,-80.32
  rectangle: -160,-310.63 -140,-80.32
  rectangle: -60,-310.63 -40,-80.32
  rectangle: 40,-310.63 60,-80.32
  rectangle: 140,-310.63 160,-80.32
  rectangle: 240,-310.63 260,-80.32
  rectangle: 340,-310.63 360,-80.32
  rectangle: 440,-310.63 460,-80.32
  rectangle: 540,-310.63 560,-80.32
  rectangle: 640,-310.63 660,-80.32
  rectangle: 740,-310.63 760,-80.32
  rectangle: 840,-310.63 860,-80.32
  rectangle: 940,-310.63 960,-80.32
  rectangle: 1040,-310.63 1060,-80.32
  lines w8: -1105.08,-80.55 1105.08,-80.55 1105.08,-4.17 -1105.08,-4.17 -1105.08,-80.55
  text "1" at 1100.59,30.51 h36.81
  text "2" at 1099.21,129.53 h36.81
Mechanical 16:
  rectangle: -1060,0 -1040,170
  rectangle: -960,0 -940,170
  rectangle: -860,0 -840,170
  rectangle: -760,0 -740,170
  rectangle: -660,0 -640,170
  rectangle: -560,0 -540,170
  rectangle: -460,0 -440,170
  rectangle: -360,0 -340,170
  rectangle: -260,0 -240,170
  rectangle: -160,0 -140,170
  rectangle: -60,0 -40,170
  rectangle: 40,0 60,170
  rectangle: 140,0 160,170
  rectangle: 240,0 260,170
  rectangle: 340,0 360,170
  rectangle: 440,0 460,170
  rectangle: 540,0 560,170
  rectangle: 640,0 660,170
  rectangle: 740,0 760,170
  rectangle: 840,0 860,170
  rectangle: 940,0 960,170
  rectangle: 1040,0 1060,170

## TSW-122-02-S-Q [mm]
pads (44):
  oct 1.5x1.5 hole 1: 1(26.67,-2.54) 2(26.67,2.54) 3(24.13,-2.54) 4(24.13,2.54) 5(21.59,-2.54) 6(21.59,2.54) 7(19.05,-2.54) 8(19.05,2.54) 9(16.51,-2.54) 10(16.51,2.54) 11(13.97,-2.54) 12(13.97,2.54) 13(11.43,-2.54) 14(11.43,2.54) 15(8.89,-2.54) 16(8.89,2.54) 17(6.35,-2.54) 18(6.35,2.54) 19(3.81,-2.54) 20(3.81,2.54) 21(1.27,-2.54) 22(1.27,2.54) 23(-1.27,-2.54) 24(-1.27,2.54) 25(-3.81,-2.54) 26(-3.81,2.54) 27(-6.35,-2.54) 28(-6.35,2.54) 29(-8.89,-2.54) 30(-8.89,2.54) 31(-11.43,-2.54) 32(-11.43,2.54) 33(-13.97,-2.54) 34(-13.97,2.54) 35(-16.51,-2.54) 36(-16.51,2.54) 37(-19.05,-2.54) 38(-19.05,2.54) 39(-21.59,-2.54) 40(-21.59,2.54) 41(-24.13,-2.54) 42(-24.13,2.54) 43(-26.67,-2.54) 44(-26.67,2.54)
Top Overlay:
  lines w0.203: -28.069,-3.695 28.069,-3.695 28.069,3.695 -28.069,3.695 -28.069,-3.695
  text "1" at 26.512,-5.138 h0.94
  text "2" at 26.412,3.989 h0.94
Mechanical 16:
  rectangle: -27.02,-2.89 -26.32,-2.19
  rectangle: -27.02,2.19 -26.32,2.89
  rectangle: -24.48,-2.89 -23.78,-2.19
  rectangle: -24.48,2.19 -23.78,2.89
  rectangle: -21.94,-2.89 -21.24,-2.19
  rectangle: -21.94,2.19 -21.24,2.89
  rectangle: -19.4,-2.89 -18.7,-2.19
  rectangle: -19.4,2.19 -18.7,2.89
  rectangle: -16.86,-2.89 -16.16,-2.19
  rectangle: -16.86,2.19 -16.16,2.89
  rectangle: -14.32,-2.89 -13.62,-2.19
  rectangle: -14.32,2.19 -13.62,2.89
  rectangle: -11.78,-2.89 -11.08,-2.19
  rectangle: -11.78,2.19 -11.08,2.89
  rectangle: -9.24,-2.89 -8.54,-2.19
  rectangle: -9.24,2.19 -8.54,2.89
  rectangle: -6.7,-2.89 -6,-2.19
  rectangle: -6.7,2.19 -6,2.89
  rectangle: -4.16,-2.89 -3.46,-2.19
  rectangle: -4.16,2.19 -3.46,2.89
  rectangle: -1.62,-2.89 -0.92,-2.19
  rectangle: -1.62,2.19 -0.92,2.89
  rectangle: 0.92,-2.89 1.62,-2.19
  rectangle: 0.92,2.19 1.62,2.89
  rectangle: 3.46,-2.89 4.16,-2.19
  rectangle: 3.46,2.19 4.16,2.89
  rectangle: 6,-2.89 6.7,-2.19
  rectangle: 6,2.19 6.7,2.89
  rectangle: 8.54,-2.89 9.24,-2.19
  rectangle: 8.54,2.19 9.24,2.89
  rectangle: 11.08,-2.89 11.78,-2.19
  rectangle: 11.08,2.19 11.78,2.89
  rectangle: 13.62,-2.89 14.32,-2.19
  rectangle: 13.62,2.19 14.32,2.89
  rectangle: 16.16,-2.89 16.86,-2.19
  rectangle: 16.16,2.19 16.86,2.89
  rectangle: 18.7,-2.89 19.4,-2.19
  rectangle: 18.7,2.19 19.4,2.89
  rectangle: 21.24,-2.89 21.94,-2.19
  rectangle: 21.24,2.19 21.94,2.89
  rectangle: 23.78,-2.89 24.48,-2.19
  rectangle: 23.78,2.19 24.48,2.89
  rectangle: 26.32,-2.89 27.02,-2.19
  rectangle: 26.32,2.19 27.02,2.89